# Altium footprint library Sajad_Altium_Library.PcbLib: 380 footprints (part 8 of 24)
Each footprint in its own frame and in the unit in brackets; x right, y up, seen from the top. Pads: shape width x height; smd on the part's side, far side on the other; paste and mask are expansions set on the pad; w line width, h text height; cw(c..) or ccw(c..) is an arc to the next point about the centre after c.
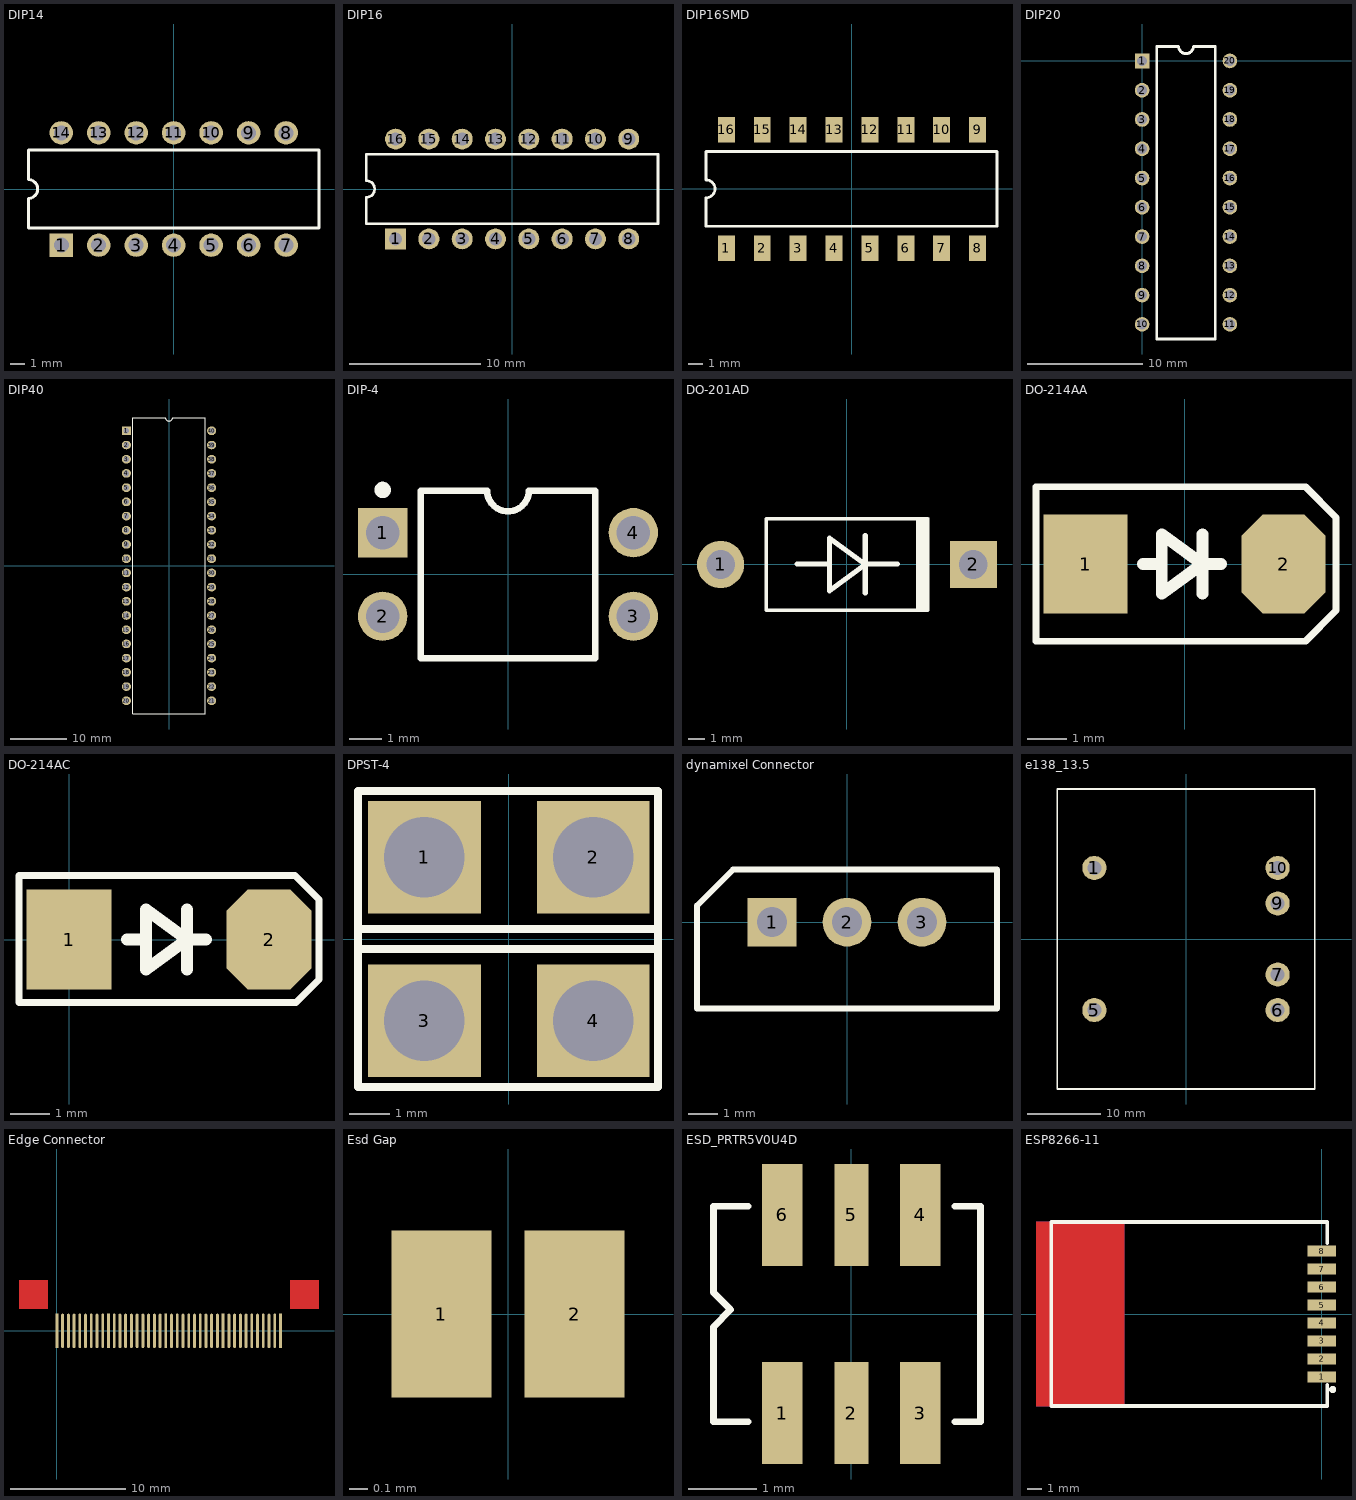
[diagram p7: the footprints below, top view; thin cyan lines are the x and y axes]

## DIP14 [mil] "DIP; 14 Leads; Row Spacing 7.62 mm; Pitch 2.54 mm"
height 200
pads (14):
  rect 63x62 hole 40: 1(-300,-150)
  oval 63x62 hole 40: 2(-200,-150) 3(-100,-150) 4(0,-150) 5(100,-150) 6(200,-150) 7(300,-150) 8(300,150) 9(200,150) 10(100,150) 11(0,150) 12(-100,150) 13(-200,150) 14(-300,150)
Top Overlay:
  lines w7.87: -387.8,-104.33 -387.8,-25 ccw(c-387.8,0) -387.8,25 -387.8,104.33 387.79,104.33 387.79,-104.33 -387.8,-104.33
3D body: height 200.79, standoff -129.92, extent -393.71,-154.92 393.7,154.92

## DIP16 [mil] "DIP; 16 Leads; Row Spacing 7.62 mm; Pitch 2.54 mm"
height 200
pads (16):
  rect 63x62 hole 40: 1(-350,-150)
  oval 63x62 hole 40: 2(-250,-150) 3(-150,-150) 4(-50,-150) 5(50,-150) 6(150,-150) 7(250,-150) 8(350,-150) 9(350,150) 10(250,150) 11(150,150) 12(50,150) 13(-50,150) 14(-150,150) 15(-250,150) 16(-350,150)
Top Overlay:
  lines w7.87: -437.8,-104.33 437.79,-104.33 437.79,104.33 -437.8,104.33 -437.8,25 cw(c-437.8,0) -437.8,-25 -437.8,-104.33
3D body: height 200.79, standoff -129.92, extent -392.69,-154.92 394.71,154.92

## DIP16SMD [mm] "DIP; 16 Leads; Row Spacing 7.62 mm; Pitch 2.54 mm"
height 5.08
pads (16):
  rect 1.2x1.8 smd: 1(-8.89,-4.191) 2(-6.35,-4.191) 3(-3.81,-4.191) 4(-1.27,-4.191) 5(1.27,-4.191) 6(3.81,-4.191) 7(6.35,-4.191) 8(8.89,-4.191) 9(8.89,4.166) 10(6.35,4.166) 11(3.81,4.166) 12(1.27,4.166) 13(-1.27,4.166) 14(-3.81,4.166) 15(-6.35,4.166) 16(-8.89,4.166)
Top Overlay:
  lines w0.2: -10.338,-2.65 10.262,-2.65 10.262,2.65 -10.338,2.65 ; -10.333,-2.65 -10.333,-0.635 ccw(c-10.333,0) -10.333,0.635 -10.333,2.65
3D body: height 5.1, standoff -3.3, extent -10,-3.935 10,3.935

## DIP20 [mil]
pads (20):
  rect 50x50 hole 35: 1(0,0)
  round 50 hole 35: 2(0,-100) 3(0,-200) 4(0,-300) 5(0,-400) 6(0,-500) 7(0,-600) 8(0,-700) 9(0,-800) 10(0,-900) 11(300,-900) 12(300,-800) 13(300,-700) 14(300,-600) 15(300,-500) 16(300,-400) 17(300,-300) 18(300,-200) 19(300,-100) 20(300,0)
Top Overlay:
  lines w10: 50,-950 50,50 125,50 ccw(c150,50) 175,50 250,50 250,-950 50,-950

## DIP40 [mil] "DIP 40 pin"
pads (40):
  rect 65x60 hole 40: 1(-300,950)
  oval 65x60 hole 40: 2(-300,850) 3(-300,750) 4(-300,650) 5(-300,550) 6(-300,450) 7(-300,350) 8(-300,250) 9(-300,150) 10(-300,50) 11(-300,-50) 12(-300,-150) 13(-300,-250) 14(-300,-350) 15(-300,-450) 16(-300,-550) 17(-300,-650) 18(-300,-750) 19(-300,-850) 20(-300,-950) 21(300,-950) 22(300,-850) 23(300,-750) 24(300,-650) 25(300,-550) 26(300,-450) 27(300,-350) 28(300,-250) 29(300,-150) 30(300,-50) 31(300,50) 32(300,150) 33(300,250) 34(300,350) 35(300,450) 36(300,550) 37(300,650) 38(300,750) 39(300,850) 40(300,950)
Top Overlay:
  lines w7.87: -253.94,-1043.31 -253.94,1043.31 -25,1043.31 ccw(c0,1043.31) 25,1043.31 253.94,1043.31 253.94,-1043.31 -253.94,-1043.31
3D body: height 216.54, standoff -153.54, extent -301.18,-984.25 301.18,984.25

## DIP-4 [mm] "DIP; 4 Leads; Row Spacing 7.62 mm; Pitch 2.54 mm"
height 5.6
pads (4):
  rect 1.5x1.5 hole 1.016: 1(-3.81,1.27)
  round 1.5 hole 1.016: 2(-3.81,-1.27) 3(3.81,-1.27) 4(3.81,1.27)
Top Overlay:
  circle w0.25: c-3.81,2.57 r0.125
  lines w0.2: -2.65,-2.55 2.65,-2.55 2.65,2.55 0.635,2.55 cw(c0,2.55) -0.635,2.55 -2.65,2.55 -2.65,-2.55
3D body: height 4.31, standoff -3.28, extent -4,-2.77 4,2.77

## DO-201AD [mm] "Diode, Axial; Body 9.5 x 5.6 mm (LxDia. max), Lead Dia. 1.32 mm (max)"
height 5.6
pads (2):
  round 2.8 hole 1.7: 1(-7.5,0)
  rect 2.8x2.8 hole 1.7: 2(7.5,0)
Top Overlay:
  rectangle: 4.09,-2.743 4.89,2.8
  lines w0.2: 4.79,-2.724 -4.801,-2.724 -4.801,2.724 4.79,2.724
  lines w0.305: -2.972,0.025 -1.041,0.025 ; 1.079,-1.682 1.079,0.052 ; 1.079,1.727 1.079,-0.007 -1.041,-1.559 -1.041,1.559 1.058,0.023 2.988,0.023
3D body: height 7.6, standoff -4, extent -8.305,-2.794 8.255,2.806

## DO-214AA [mil] "DO-214AA (SMB)"
pads (2):
  rect 85x100 smd: 1(-100,0)
  oct 85x100 smd: 2(100,0)
Top Overlay:
  lines w7: -150,-78 -150,78 122,78 153,47 153,-47 122,-78 -150,-78
  lines w12: 18,-30 18,30 ; 37,0 18,0 ; 18,0 -23,30 -23,-30 18,0 ; -42,0 -23,0 -42,0
3D body: height 86.65, standoff -1.97, extent -104.33,-72.84 104.33,72.83

## DO-214AC [mil] "1N4001-7 SMD DIODE"
pads (2):
  rect 85x100 smd: 1(0,0)
  oct 85x100 smd: 2(200,0)
Top Overlay:
  lines w7: -50,-63 143,-63 227,-63 250,-40 250,40 226,64 144,64 -50,64 -50,-63
  lines w12: 118,-30 118,30 ; 137,0 118,0 ; 118,0 77,30 77,-30 118,0 ; 58,0 77,0 58,0
3D body: height 88.31, standoff -1.69, extent -8.01,-55 207.99,54.99

## DPST-4 [mm] "Double-Pole, Single-Throw Switch; 4 Leads"
pads (4):
  rect 2.8x2.8 hole 2: 1(-2.095,2.032) 2(2.095,2.032) 3(-2.095,-2.032) 4(2.095,-2.032)
Top Overlay:
  lines w0.2: -3.746,-0.254 3.708,-0.254 ; -3.746,0.254 3.708,0.254 ; -3.746,-3.683 -3.746,3.683 3.708,3.683 3.708,-3.683 -3.746,-3.683

## dynamixel Connector [mil] "Dynamixel connector"
pads (3):
  rect 65x65 hole 40: 1(-100,0)
  round 65 hole 40: 2(0,0) 3(100,0)
Top Overlay:
  lines w7.87: -200,-115 -200,22 -152,70 200,70 200,-115 -200,-115

## e138_13.5 [mil] "On Board Transformer"
pads (6):
  round 130 hole 75: 1(-495,384) 5(-495,-384) 6(495,-384) 7(495,-192) 9(495,192) 10(495,384)
Top Overlay:
  lines w10: -695,-810 -695,810 695,810 695,-810 -695,-810
3D body: height 1200, standoff 0, extent -700,-815 700,815

## Edge Connector [mm]
height 1.7
pads (40):
  rect 0.25x3 smd: 1(19.5,0) 11(14.5,0) 21(9.5,0) 31(4.5,0) 40(0,0)
  oval 0.25x3 smd: 2(19,0) 3(18.5,0) 4(18,0) 5(17.5,0) 6(17,0) 7(16.5,0) 8(16,0) 9(15.5,0) 10(15,0) 12(14,0) 13(13.5,0) 14(13,0) 15(12.5,0) 16(12,0) 17(11.5,0) 18(11,0) 19(10.5,0) 20(10,0) 22(9,0) 23(8.5,0) 24(8,0) 25(7.5,0) 26(7,0) 27(6.5,0) 28(6,0) 29(5.5,0) 30(5,0) 32(4,0) 33(3.5,0) 34(3,0) 35(2.5,0) 36(2,0) 37(1.5,0) 38(1,0) 39(0.5,0)
Top Layer:
  rectangle: -3.302,1.905 -0.762,4.445
  rectangle: 20.32,1.905 22.86,4.445
3D body: height 1.24, standoff -0.03, extent -3.071,0.381 22.629,4.638

## Esd Gap [mil] "Esp Gap"
pads (2):
  rect 21x35 smd mask+3: 1(-14,0) 2(14,0)

## ESD_PRTR5V0U4D [mm]
height 0.55
pads (6):
  rect 0.6x1.5 smd: 1(-1.016,-1.46) 3(1.016,-1.46) 4(1.016,1.46) 6(-1.016,1.46)
  rect 0.5x1.5 smd: 2(0,-1.46) 5(0,1.46)
Top Overlay:
  lines w0.1: -1.524,-1.587 -2.032,-1.587 -2.032,-0.191 -1.778,0.064 -2.032,0.318 -2.032,1.587 -1.524,1.587 ; 1.524,-1.587 1.905,-1.587 1.905,1.587 1.524,1.587

## ESP8266-11 [mm]
height 1.7
pads (8):
  rect 2x0.762 smd: 1(0,-4.445) 2(0,-3.175) 3(0,-1.905) 4(0,-0.635) 5(0,0.635) 6(0,1.905) 7(0,3.175) 8(0,4.445)
Top Layer:
  pour cut-out: -20.193,-6.5 -20.193,6.5 -13.97,6.5 -13.97,-6.5
Bottom Layer:
  pour cut-out: -20.193,-6.5 -20.193,6.5 -13.97,6.5 -13.97,-6.5
Top Overlay:
  circle w0.25: c0.762,-5.334 r0.125
  lines w0.254: 0.381,-5 0.381,-6.5 -19.119,-6.5 -19.119,6.5 0.381,6.5 0.381,5